# Altium schematic symbol library FPGA_Xilinx_Virtex7.SchLib: 34 symbols (part 14 of 34)
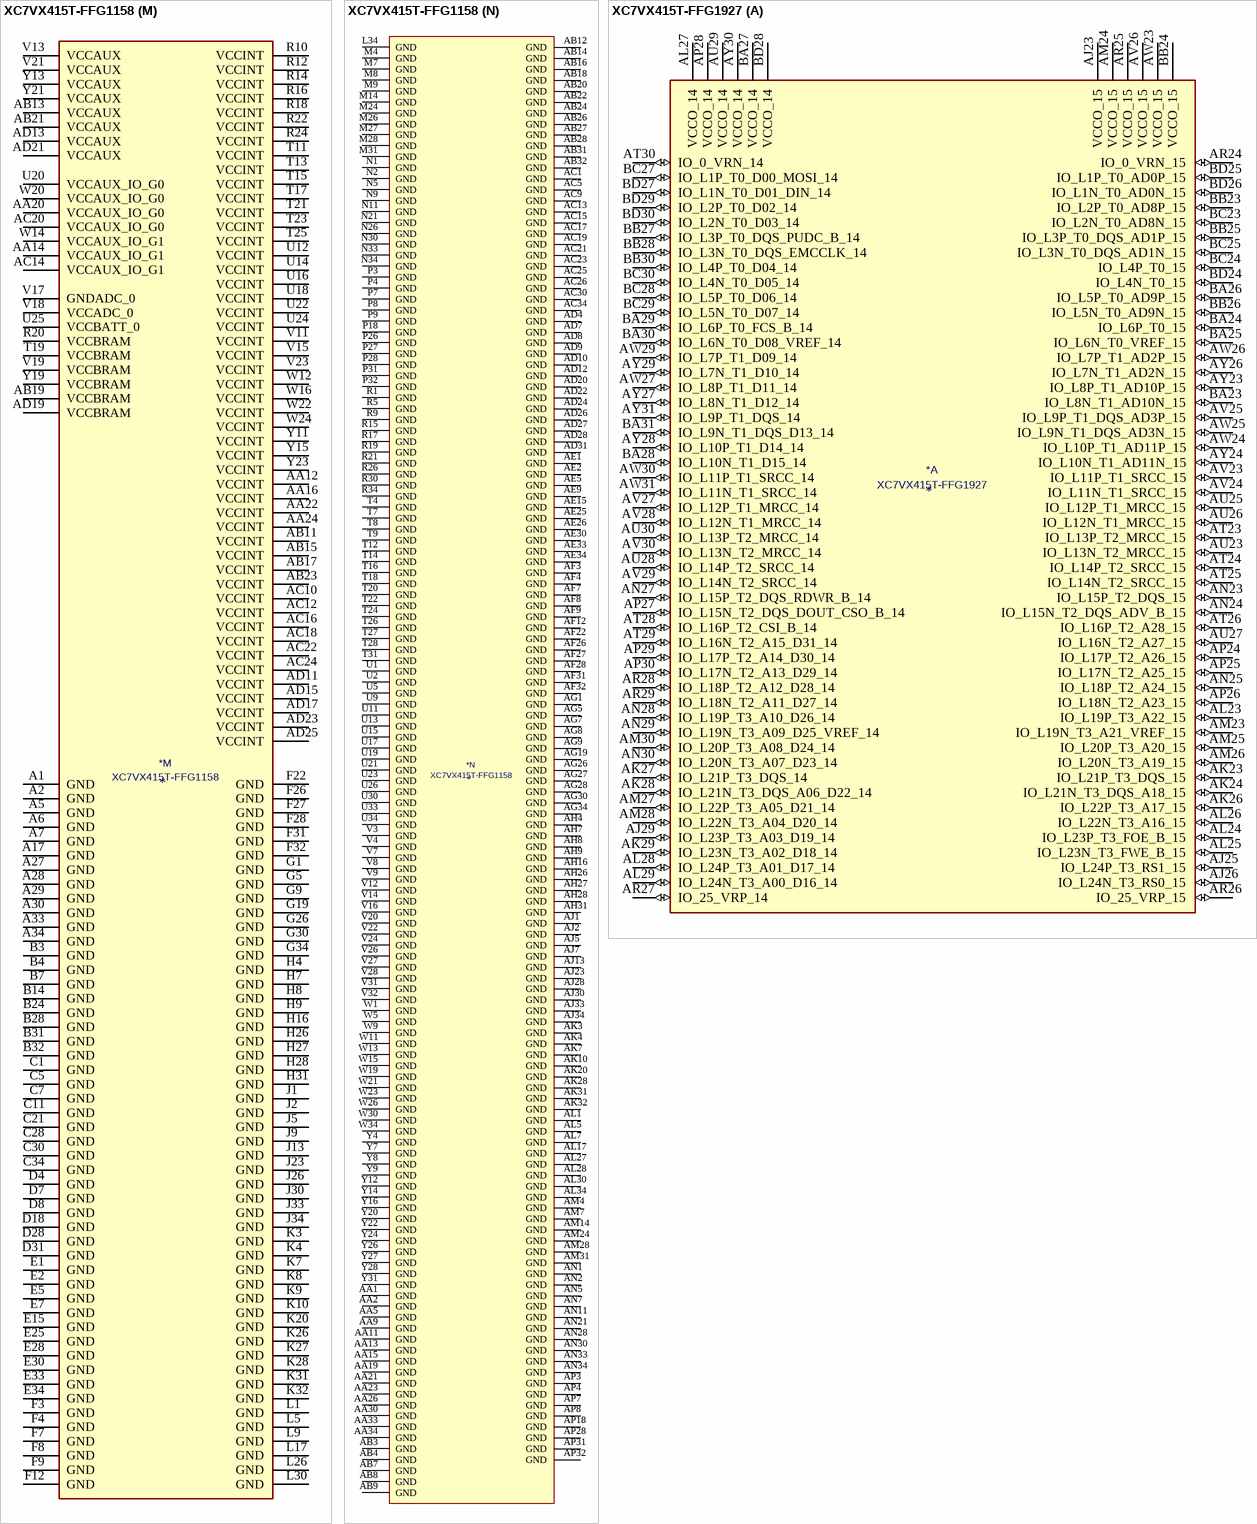
[diagram p185: symbols XC7VX415T-FFG1158 to XC7VX415T-FFG1927]

## XC7VX415T-FFG1158
designator *  value XC7VX415T-FFG1158
ki_keywords: FPGA; ki_description: Virtex 7 XT 415 XC7VX415T-FFG1158
part A pins: A8 IO_L23N_T3_FWE_B_15 (io), A9 IO_L21N_T3_DQS_A18_15 (io), A10 IO_L21P_T3_DQS_15 (io), A11 IO_L22N_T3_A16_15 (io), A12 VCCO_15 (power), A13 IO_L20N_T3_A19_15 (io), A23 IO_L1P_T0_D00_MOSI_14 (io), A24 IO_L1N_T0_D01_DIN_14 (io), A25 IO_L5N_T0_D07_14 (io), A26 IO_L2N_T0_D03_14 (io), B8 IO_L23P_T3_FOE_B_15 (io), B9 VCCO_15 (power), B10 IO_L24N_T3_RS0_15 (io), B11 IO_L24P_T3_RS1_15 (io), B12 IO_L22P_T3_A17_15 (io), B13 IO_L20P_T3_A20_15 (io), B23 IO_L3N_T0_DQS_EMCCLK_14 (io), B25 IO_L5P_T0_D06_14 (io), B26 IO_L2P_T0_D02_14 (io), B27 IO_L4N_T0_D05_14 (io), C8 IO_L19N_T3_A21_VREF_15 (io), C9 IO_L19P_T3_A22_15 (io), C10 IO_L18N_T2_A23_15 (io), C12 IO_L16N_T2_A27_15 (io), C13 IO_L16P_T2_A28_15 (io), C23 IO_L3P_T0_DQS_PUDC_B_14 (io), C24 IO_L6P_T0_FCS_B_14 (io), C25 IO_L6N_T0_D08_VREF_14 (io), C26 VCCO_14 (power), C27 IO_L4P_T0_D04_14 (io), D9 IO_L15N_T2_DQS_ADV_B_15 (io), D10 IO_L15P_T2_DQS_15 (io), D11 IO_L18P_T2_A24_15 (io), D12 IO_L14N_T2_SRCC_15 (io), D23 VCCO_14 (power), D24 IO_L9P_T1_DQS_14 (io), D25 IO_L9N_T1_DQS_D13_14 (io), D26 IO_L8N_T1_D12_14 (io), D27 IO_L10N_T1_D15_14 (io), E8 IO_L17N_T2_A25_15 (io), E9 IO_L17P_T2_A26_15 (io), E10 VCCO_15 (power), E11 IO_L13N_T2_MRCC_15 (io), E12 IO_L13P_T2_MRCC_15 (io), E13 IO_L14P_T2_SRCC_15 (io), E23 IO_L7N_T1_D10_14 (io), E24 IO_L11N_T1_SRCC_14 (io), E26 IO_L8P_T1_D11_14 (io), E27 IO_L10P_T1_D14_14 (io), F10 IO_L12N_T1_MRCC_15 (io), F11 IO_L11N_T1_SRCC_15 (io), F13 IO_L7N_T1_AD2N_15 (io), F23 IO_L7P_T1_D09_14 (io), F24 IO_L11P_T1_SRCC_14 (io), F25 IO_L12N_T1_MRCC_14 (io), G10 IO_L12P_T1_MRCC_15 (io), G11 IO_L11P_T1_SRCC_15 (io), G12 IO_L9N_T1_DQS_AD3N_15 (io), G13 IO_L7P_T1_AD2P_15 (io), G23 IO_L14N_T2_SRCC_14 (io), G24 VCCO_14 (power), G25 IO_L12P_T1_MRCC_14 (io), H10 IO_L10N_T1_AD11N_15 (io), H11 VCCO_15 (power), H12 IO_L9P_T1_DQS_AD3P_15 (io), H22 IO_L16N_T2_A15_D31_14 (io), H23 IO_L14P_T2_SRCC_14 (io), H24 IO_L13N_T2_MRCC_14 (io), H25 IO_L15N_T2_DQS_DOUT_CSO_B_14 (io), J10 IO_L10P_T1_AD11P_15 (io), J11 IO_L8N_T1_AD10N_15 (io), J12 IO_L1N_T0_AD0N_15 (io), J22 IO_L16P_T2_CSI_B_14 (io), J24 IO_L13P_T2_MRCC_14 (io), J25 IO_L15P_T2_DQS_RDWR_B_14 (io), K11 IO_L8P_T1_AD10P_15 (io), K12 IO_L1P_T0_AD0P_15 (io), K22 IO_L18P_T2_A12_D28_14 (io), K23 IO_L18N_T2_A11_D27_14 (io), K24 IO_L17N_T2_A13_D29_14 (io), K25 VCCO_14 (power), L10 IO_L3N_T0_DQS_AD1N_15 (io), L11 IO_L5N_T0_AD9N_15 (io), L12 VCCO_15 (power), L22 VCCO_14 (power), L23 IO_L20N_T3_A07_D23_14 (io), L24 IO_L17P_T2_A14_D30_14 (io), L25 IO_L23N_T3_A02_D18_14 (io), M10 IO_L3P_T0_DQS_AD1P_15 (io), M11 IO_L5P_T0_AD9P_15 (io), M12 IO_L2N_T0_AD8N_15 (io), M22 IO_L20P_T3_A08_D24_14 (io), M23 IO_L24N_T3_A00_D16_14 (io), M25 IO_L23P_T3_A03_D19_14 (io), N10 IO_L4N_T0_15 (io), N12 IO_L2P_T0_AD8P_15 (io), N22 IO_L22N_T3_A04_D20_14 (io), N23 IO_L24P_T3_A01_D17_14 (io), N24 IO_L19N_T3_A09_D25_VREF_14 (io), N25 IO_L21N_T3_DQS_A06_D22_14 (io), P10 IO_L4P_T0_15 (io), P11 IO_L6N_T0_VREF_15 (io), P12 IO_L6P_T0_15 (io), P13 VCCO_15 (power), P22 IO_L22P_T3_A05_D21_14 (io), P23 VCCO_14 (power), P24 IO_L19P_T3_A10_D26_14 (io), P25 IO_L21P_T3_DQS_14 (io), R11 IO_25_VRP_15 (io), R13 IO_0_VRN_15 (io), R23 IO_0_VRN_14 (io), R25 IO_25_VRP_14 (io)
part B pins: A14 IO_L1N_T0_16 (io), A15 IO_L1P_T0_16 (io), A16 IO_L4N_T0_16 (io), A18 IO_L4N_T0_17 (io), A19 IO_L1P_T0_17 (io), A20 IO_L1N_T0_17 (io), A21 IO_L3N_T0_DQS_17 (io), A22 VCCO_17 (power), B15 IO_L3N_T0_DQS_16 (io), B16 IO_L4P_T0_16 (io), B17 IO_L2N_T0_16 (io), B18 IO_L4P_T0_17 (io), B19 VCCO_17 (power), B20 IO_L2N_T0_17 (io), B21 IO_L3P_T0_DQS_17 (io), B22 IO_L5N_T0_17 (io), C14 IO_L5N_T0_16 (io), C15 IO_L3P_T0_DQS_16 (io), C16 VCCO_16 (power), C17 IO_L2P_T0_16 (io), C18 IO_L6P_T0_17 (io), C19 IO_L6N_T0_VREF_17 (io), C20 IO_L2P_T0_17 (io), C22 IO_L5P_T0_17 (io), D13 VCCO_16 (power), D14 IO_L10N_T1_16 (io), D15 IO_L5P_T0_16 (io), D16 IO_L6N_T0_VREF_16 (io), D17 IO_L6P_T0_16 (io), D19 IO_L9P_T1_DQS_17 (io), D20 IO_L9N_T1_DQS_17 (io), D21 IO_L11N_T1_SRCC_17 (io), D22 IO_L7N_T1_17 (io), E14 IO_L10P_T1_16 (io), E16 IO_L8N_T1_16 (io), E17 IO_L8P_T1_16 (io), E18 IO_L8P_T1_17 (io), E19 IO_L8N_T1_17 (io), E20 VCCO_17 (power), E21 IO_L11P_T1_SRCC_17 (io), E22 IO_L7P_T1_17 (io), F14 IO_L12N_T1_MRCC_16 (io), F15 IO_L12P_T1_MRCC_16 (io), F16 IO_L9N_T1_DQS_16 (io), F17 VCCO_16 (power), F18 IO_L10P_T1_17 (io), F19 IO_L10N_T1_17 (io), F20 IO_L12P_T1_MRCC_17 (io), F21 IO_L12N_T1_MRCC_17 (io), G14 VCCO_16 (power), G15 IO_L11N_T1_SRCC_16 (io), G16 IO_L9P_T1_DQS_16 (io), G17 IO_L7N_T1_16 (io), G18 IO_L15N_T2_DQS_17 (io), G20 IO_L13N_T2_MRCC_17 (io), G21 IO_L14P_T2_SRCC_17 (io), G22 IO_L14N_T2_SRCC_17 (io), H13 IO_L13N_T2_MRCC_16 (io), H14 IO_L13P_T2_MRCC_16 (io), H15 IO_L11P_T1_SRCC_16 (io), H17 IO_L7P_T1_16 (io), H18 IO_L15P_T2_DQS_17 (io), H19 IO_L18N_T2_17 (io), H20 IO_L13P_T2_MRCC_17 (io), H21 VCCO_17 (power), J14 IO_L14N_T2_SRCC_16 (io), J15 IO_L16N_T2_16 (io), J16 IO_L16P_T2_16 (io), J17 IO_0_VRN_16 (io), J18 VCCO_17 (power), J19 IO_L18P_T2_17 (io), J20 IO_L16P_T2_17 (io), J21 IO_L16N_T2_17 (io), K13 IO_L17N_T2_16 (io), K14 IO_L14P_T2_SRCC_16 (io), K15 VCCO_16 (power), K16 IO_L18N_T2_16 (io), K17 IO_L18P_T2_16 (io), K18 IO_L17P_T2_17 (io), K19 IO_L17N_T2_17 (io), K21 IO_0_VRN_17 (io), L13 IO_L17P_T2_16 (io), L14 IO_L15N_T2_DQS_16 (io), L15 IO_L15P_T2_DQS_16 (io), L16 IO_L20N_T3_16 (io), L18 IO_L19P_T3_17 (io), L19 IO_L19N_T3_VREF_17 (io), L20 IO_L22N_T3_17 (io), L21 IO_L20N_T3_17 (io), M13 IO_L19N_T3_VREF_16 (io), M15 IO_L22N_T3_16 (io), M16 IO_L20P_T3_16 (io), M17 IO_L24N_T3_16 (io), M18 IO_L21N_T3_DQS_17 (io), M19 VCCO_17 (power), M20 IO_L22P_T3_17 (io), M21 IO_L20P_T3_17 (io), N13 IO_L19P_T3_16 (io), N14 IO_L21N_T3_DQS_16 (io), N15 IO_L22P_T3_16 (io), N16 VCCO_16 (power), N17 IO_L24P_T3_16 (io), N18 IO_L21P_T3_DQS_17 (io), N19 IO_L23N_T3_17 (io), N20 IO_L24N_T3_17 (io), P14 IO_L21P_T3_DQS_16 (io), P15 IO_L23N_T3_16 (io), P16 IO_L23P_T3_16 (io), P17 IO_25_VRP_16 (io), P19 IO_L23P_T3_17 (io), P20 IO_L24P_T3_17 (io), P21 IO_25_VRP_17 (io)
part C pins: AD16 IO_25_VRP_34 (io), AD18 IO_0_VRN_34 (io), AE16 IO_L1N_T0_34 (io), AE17 IO_L1P_T0_34 (io), AE18 IO_L5P_T0_34 (io), AE19 IO_L3P_T0_DQS_34 (io), AE20 VCCO_34 (power), AE21 IO_25_VRP_35 (io), AE22 IO_0_VRN_35 (io), AE23 IO_L2P_T0_AD12P_35 (io), AE24 IO_L4P_T0_35 (io), AF15 IO_L15P_T2_DQS_34 (io), AF16 IO_L6P_T0_34 (io), AF17 VCCO_34 (power), AF18 IO_L5N_T0_34 (io), AF19 IO_L3N_T0_DQS_34 (io), AF20 IO_L2P_T0_34 (io), AF21 IO_L6P_T0_35 (io), AF23 IO_L2N_T0_AD12N_35 (io), AF24 IO_L4N_T0_35 (io), AF25 IO_L1P_T0_AD4P_35 (io), AG15 IO_L15N_T2_DQS_34 (io), AG16 IO_L6N_T0_VREF_34 (io), AG17 IO_L4N_T0_34 (io), AG18 IO_L4P_T0_34 (io), AG20 IO_L2N_T0_34 (io), AG21 IO_L6N_T0_VREF_35 (io), AG22 IO_L5P_T0_AD13P_35 (io), AG23 IO_L3P_T0_DQS_AD5P_35 (io), AG24 VCCO_35 (power), AG25 IO_L1N_T0_AD4N_35 (io), AH15 IO_L17P_T2_34 (io), AH17 IO_L16N_T2_34 (io), AH18 IO_L16P_T2_34 (io), AH19 IO_L18P_T2_34 (io), AH20 IO_L7P_T1_34 (io), AH21 VCCO_35 (power), AH22 IO_L5N_T0_AD13N_35 (io), AH23 IO_L3N_T0_DQS_AD5N_35 (io), AH24 IO_L11P_T1_SRCC_35 (io), AH25 IO_L9P_T1_DQS_AD7P_35 (io), AJ15 IO_L17N_T2_34 (io), AJ16 IO_L13P_T2_MRCC_34 (io), AJ17 IO_L14P_T2_SRCC_34 (io), AJ18 VCCO_34 (power), AJ19 IO_L18N_T2_34 (io), AJ20 IO_L7N_T1_34 (io), AJ21 IO_L10P_T1_AD15P_35 (io), AJ22 IO_L8P_T1_AD14P_35 (io), AJ24 IO_L11N_T1_SRCC_35 (io), AJ25 IO_L9N_T1_DQS_AD7N_35 (io), AJ26 IO_L7P_T1_AD6P_35 (io), AJ27 IO_L19P_T3_35 (io), AK15 VCCO_34 (power), AK16 IO_L13N_T2_MRCC_34 (io), AK17 IO_L14N_T2_SRCC_34 (io), AK18 IO_L12P_T1_MRCC_34 (io), AK19 IO_L11P_T1_SRCC_34 (io), AK21 IO_L10N_T1_AD15N_35 (io), AK22 IO_L8N_T1_AD14N_35 (io), AK23 IO_L12P_T1_MRCC_35 (io), AK24 IO_L12N_T1_MRCC_35 (io), AK25 VCCO_35 (power), AK26 IO_L7N_T1_AD6N_35 (io), AK27 IO_L19N_T3_VREF_35 (io), AL15 IO_L19P_T3_34 (io), AL16 IO_L20P_T3_34 (io), AL18 IO_L12N_T1_MRCC_34 (io), AL19 IO_L11N_T1_SRCC_34 (io), AL20 IO_L9P_T1_DQS_34 (io), AL21 IO_L17P_T2_35 (io), AL22 VCCO_35 (power), AL23 IO_L14P_T2_SRCC_35 (io), AL24 IO_L14N_T2_SRCC_35 (io), AL25 IO_L13P_T2_MRCC_35 (io), AL26 IO_L13N_T2_MRCC_35 (io), AM15 IO_L19N_T3_VREF_34 (io), AM16 IO_L20N_T3_34 (io), AM17 IO_L8N_T1_34 (io), AM18 IO_L8P_T1_34 (io), AM19 VCCO_34 (power), AM20 IO_L9N_T1_DQS_34 (io), AM21 IO_L17N_T2_35 (io), AM22 IO_L16P_T2_35 (io), AM23 IO_L15P_T2_DQS_35 (io), AM25 IO_L20P_T3_35 (io), AM26 IO_L20N_T3_35 (io), AM27 IO_L21P_T3_DQS_35 (io), AN15 IO_L23P_T3_34 (io), AN16 VCCO_34 (power), AN17 IO_L22N_T3_34 (io), AN18 IO_L22P_T3_34 (io), AN19 IO_L24P_T3_34 (io), AN20 IO_L10P_T1_34 (io), AN22 IO_L16N_T2_35 (io), AN23 IO_L15N_T2_DQS_35 (io), AN24 IO_L22P_T3_35 (io), AN25 IO_L24P_T3_35 (io), AN26 VCCO_35 (power), AN27 IO_L21N_T3_DQS_35 (io), AP15 IO_L23N_T3_34 (io), AP16 IO_L21N_T3_DQS_34 (io), AP17 IO_L21P_T3_DQS_34 (io), AP19 IO_L24N_T3_34 (io), AP20 IO_L10N_T1_34 (io), AP21 IO_L18P_T2_35 (io), AP22 IO_L18N_T2_35 (io), AP23 VCCO_35 (power), AP24 IO_L22N_T3_35 (io), AP25 IO_L24N_T3_35 (io), AP26 IO_L23P_T3_35 (io), AP27 IO_L23N_T3_35 (io)
part D pins: AD14 IO_25_VRP_36 (io), AE11 IO_L3P_T0_DQS_36 (io), AE12 IO_0_VRN_36 (io), AE13 IO_L16P_T2_36 (io), AE14 IO_L18P_T2_36 (io), AF10 IO_L3N_T0_DQS_36 (io), AF11 IO_L5P_T0_36 (io), AF13 IO_L16N_T2_36 (io), AF14 IO_L18N_T2_36 (io), AG10 IO_L6P_T0_36 (io), AG11 IO_L5N_T0_36 (io), AG12 IO_L15P_T2_DQS_36 (io), AG13 IO_L17P_T2_36 (io), AG14 VCCO_36 (power), AH10 IO_L6N_T0_VREF_36 (io), AH11 VCCO_36 (power), AH12 IO_L15N_T2_DQS_36 (io), AH13 IO_L17N_T2_36 (io), AH14 IO_L19P_T3_36 (io), AJ8 VCCO_36 (power), AJ9 IO_L1N_T0_36 (io), AJ10 IO_L1P_T0_36 (io), AJ11 IO_L13P_T2_MRCC_36 (io), AJ12 IO_L14P_T2_SRCC_36 (io), AJ14 IO_L19N_T3_VREF_36 (io), AK8 IO_L2P_T0_36 (io), AK9 IO_L4P_T0_36 (io), AK11 IO_L13N_T2_MRCC_36 (io), AK12 IO_L14N_T2_SRCC_36 (io), AK13 IO_L21P_T3_DQS_36 (io), AK14 IO_L23P_T3_36 (io), AL8 IO_L2N_T0_36 (io), AL9 IO_L4N_T0_36 (io), AL10 IO_L12P_T1_MRCC_36 (io), AL11 IO_L11P_T1_SRCC_36 (io), AL12 VCCO_36 (power), AL13 IO_L21N_T3_DQS_36 (io), AL14 IO_L23N_T3_36 (io), AM8 IO_L8P_T1_36 (io), AM9 VCCO_36 (power), AM10 IO_L12N_T1_MRCC_36 (io), AM11 IO_L11N_T1_SRCC_36 (io), AM12 IO_L20P_T3_36 (io), AM13 IO_L22P_T3_36 (io), AN8 IO_L8N_T1_36 (io), AN9 IO_L10P_T1_36 (io), AN10 IO_L7P_T1_36 (io), AN12 IO_L20N_T3_36 (io), AN13 IO_L22N_T3_36 (io), AN14 IO_L24P_T3_36 (io), AP9 IO_L10N_T1_36 (io), AP10 IO_L7N_T1_36 (io), AP11 IO_L9N_T1_DQS_36 (io), AP12 IO_L9P_T1_DQS_36 (io), AP13 VCCO_36 (power), AP14 IO_L24N_T3_36 (io)
part E pins: AB5 MGTREFCLK0N_115 (io), AB6 MGTREFCLK0P_115 (io), AC7 MGTREFCLK1N_115 (io), AC8 MGTREFCLK1P_115 (io), AD1 MGTHTXN3_115 (io), AD2 MGTHTXP3_115 (io), AD5 MGTREFCLK0N_114 (io), AD6 MGTREFCLK0P_114 (io), AE3 MGTHRXN3_115 (io), AE4 MGTHRXP3_115 (io), AE7 MGTREFCLK1N_114 (io), AE8 MGTREFCLK1P_114 (io), AF1 MGTHTXN2_115 (io), AF2 MGTHTXP2_115 (io), AF5 MGTHRXN2_115 (io), AF6 MGTHRXP2_115 (io), AG3 MGTHRXN1_115 (io), AG4 MGTHRXP1_115 (io), AH1 MGTHTXN1_115 (io), AH2 MGTHTXP1_115 (io), AH5 MGTHRXN0_115 (io), AH6 MGTHRXP0_115 (io), AJ3 MGTHTXN0_115 (io), AJ4 MGTHTXP0_115 (io), AK1 MGTHTXN3_114 (io), AK2 MGTHTXP3_114 (io), AK5 MGTHRXN3_114 (io), AK6 MGTHRXP3_114 (io), AL3 MGTHRXN2_114 (io), AL4 MGTHRXP2_114 (io), AM1 MGTHTXN2_114 (io), AM2 MGTHTXP2_114 (io), AM5 MGTHRXN1_114 (io), AM6 MGTHRXP1_114 (io), AN3 MGTHTXN1_114 (io), AN4 MGTHTXP1_114 (io), AP1 MGTHTXN0_114 (io), AP2 MGTHTXP0_114 (io), AP5 MGTHRXN0_114 (io), AP6 MGTHRXP0_114 (io)
part F pins: AA3 MGTHRXN1_116 (io), AA4 MGTHRXP1_116 (io), AA7 MGTREFCLK1N_116 (io), AA8 MGTREFCLK1P_116 (io), AB1 MGTHTXN0_116 (io), AB2 MGTHTXP0_116 (io), AC3 MGTHRXN0_116 (io), AC4 MGTHRXP0_116 (io), L3 MGTHRXN3_117 (io), L4 MGTHRXP3_117 (io), N3 MGTHTXN3_117 (io), N4 MGTHTXP3_117 (io), P1 MGTHTXN2_117 (io), P2 MGTHTXP2_117 (io), P5 MGTHRXN2_117 (io), P6 MGTHRXP2_117 (io), R3 MGTHRXN1_117 (io), R4 MGTHRXP1_117 (io), R7 MGTREFCLK0N_117 (io), R8 MGTREFCLK0P_117 (io), T1 MGTHTXN1_117 (io), T2 MGTHTXP1_117 (io), T5 MGTHRXN0_117 (io), T6 MGTHRXP0_117 (io), U3 MGTHTXN0_117 (io), U4 MGTHTXP0_117 (io), U7 MGTREFCLK1N_117 (io), U8 MGTREFCLK1P_117 (io), V1 MGTHTXN3_116 (io), V2 MGTHTXP3_116 (io), V5 MGTHRXN3_116 (io), V6 MGTHRXP3_116 (io), W3 MGTHTXN2_116 (io), W4 MGTHTXP2_116 (io), W7 MGTREFCLK0N_116 (io), W8 MGTREFCLK0P_116 (io), Y1 MGTHTXN1_116 (io), Y2 MGTHTXP1_116 (io), Y5 MGTHRXN2_116 (io), Y6 MGTHRXP2_116 (io)
part G pins: A3 MGTHTXN3_119 (io), A4 MGTHTXP3_119 (io), B1 MGTHTXN2_119 (io), B2 MGTHTXP2_119 (io), B5 MGTHRXN3_119 (io), B6 MGTHRXP3_119 (io), C3 MGTHRXN2_119 (io), C4 MGTHRXP2_119 (io), D1 MGTHTXN1_119 (io), D2 MGTHTXP1_119 (io), D5 MGTHRXN1_119 (io), D6 MGTHRXP1_119 (io), E3 MGTHRXN0_119 (io), E4 MGTHRXP0_119 (io), F1 MGTHTXN0_119 (io), F2 MGTHTXP0_119 (io), F5 MGTHRXN3_118 (io), F6 MGTHRXP3_118 (io), G3 MGTHTXN3_118 (io), G4 MGTHTXP3_118 (io), H1 MGTHTXN2_118 (io), H2 MGTHTXP2_118 (io), H5 MGTHRXN2_118 (io), H6 MGTHRXP2_118 (io), J3 MGTHRXN1_118 (io), J4 MGTHRXP1_118 (io), J7 MGTREFCLK0N_119 (io), J8 MGTREFCLK0P_119 (io), K1 MGTHTXN1_118 (io), K2 MGTHTXP1_118 (io), K5 MGTHRXN0_118 (io), K6 MGTHRXP0_118 (io), L7 MGTREFCLK1N_119 (io), L8 MGTREFCLK1P_119 (io), M1 MGTHTXN0_118 (io), M2 MGTHTXP0_118 (io), M5 MGTREFCLK0N_118 (io), M6 MGTREFCLK0P_118 (io), N7 MGTREFCLK1N_118 (io), N8 MGTREFCLK1P_118 (io)
part H pins: AB29 MGTREFCLK0P_215 (io), AB30 MGTREFCLK0N_215 (io), AC27 MGTREFCLK1P_215 (io), AC28 MGTREFCLK1N_215 (io), AD29 MGTREFCLK0P_214 (io), AD30 MGTREFCLK0N_214 (io), AD33 MGTHTXP3_215 (io), AD34 MGTHTXN3_215 (io), AE27 MGTREFCLK1P_214 (io), AE28 MGTREFCLK1N_214 (io), AE31 MGTHRXP3_215 (io), AE32 MGTHRXN3_215 (io), AF29 MGTHRXP2_215 (io), AF30 MGTHRXN2_215 (io), AF33 MGTHTXP2_215 (io), AF34 MGTHTXN2_215 (io), AG31 MGTHRXP1_215 (io), AG32 MGTHRXN1_215 (io), AH29 MGTHRXP0_215 (io), AH30 MGTHRXN0_215 (io), AH33 MGTHTXP1_215 (io), AH34 MGTHTXN1_215 (io), AJ31 MGTHTXP0_215 (io), AJ32 MGTHTXN0_215 (io), AK29 MGTHRXP3_214 (io), AK30 MGTHRXN3_214 (io), AK33 MGTHTXP3_214 (io), AK34 MGTHTXN3_214 (io), AL31 MGTHRXP2_214 (io), AL32 MGTHRXN2_214 (io), AM29 MGTHRXP1_214 (io), AM30 MGTHRXN1_214 (io), AM33 MGTHTXP2_214 (io), AM34 MGTHTXN2_214 (io), AN31 MGTHTXP1_214 (io), AN32 MGTHTXN1_214 (io), AP29 MGTHRXP0_214 (io), AP30 MGTHRXN0_214 (io), AP33 MGTHTXP0_214 (io), AP34 MGTHTXN0_214 (io)
part I pins: AA27 MGTREFCLK1P_216 (io), AA28 MGTREFCLK1N_216 (io), AA31 MGTHRXP1_216 (io), AA32 MGTHRXN1_216 (io), AB33 MGTHTXP0_216 (io), AB34 MGTHTXN0_216 (io), AC31 MGTHRXP0_216 (io), AC32 MGTHRXN0_216 (io), L31 MGTHRXP3_217 (io), L32 MGTHRXN3_217 (io), N31 MGTHTXP3_217 (io), N32 MGTHTXN3_217 (io), P29 MGTHRXP2_217 (io), P30 MGTHRXN2_217 (io), P33 MGTHTXP2_217 (io), P34 MGTHTXN2_217 (io), R27 MGTREFCLK0P_217 (io), R28 MGTREFCLK0N_217 (io), R31 MGTHRXP1_217 (io), R32 MGTHRXN1_217 (io), T29 MGTHRXP0_217 (io), T30 MGTHRXN0_217 (io), T33 MGTHTXP1_217 (io), T34 MGTHTXN1_217 (io), U27 MGTREFCLK1P_217 (io), U28 MGTREFCLK1N_217 (io), U31 MGTHTXP0_217 (io), U32 MGTHTXN0_217 (io), V29 MGTHRXP3_216 (io), V30 MGTHRXN3_216 (io), V33 MGTHTXP3_216 (io), V34 MGTHTXN3_216 (io), W27 MGTREFCLK0P_216 (io), W28 MGTREFCLK0N_216 (io), W31 MGTHTXP2_216 (io), W32 MGTHTXN2_216 (io), Y29 MGTHRXP2_216 (io), Y30 MGTHRXN2_216 (io), Y33 MGTHTXP1_216 (io), Y34 MGTHTXN1_216 (io)
part J pins: A31 MGTHTXP3_219 (io), A32 MGTHTXN3_219 (io), B29 MGTHRXP3_219 (io), B30 MGTHRXN3_219 (io), B33 MGTHTXP2_219 (io), B34 MGTHTXN2_219 (io), C31 MGTHRXP2_219 (io), C32 MGTHRXN2_219 (io), D29 MGTHRXP1_219 (io), D30 MGTHRXN1_219 (io), D33 MGTHTXP1_219 (io), D34 MGTHTXN1_219 (io), E31 MGTHRXP0_219 (io), E32 MGTHRXN0_219 (io), F29 MGTHRXP3_218 (io), F30 MGTHRXN3_218 (io), F33 MGTHTXP0_219 (io), F34 MGTHTXN0_219 (io), G31 MGTHTXP3_218 (io), G32 MGTHTXN3_218 (io), H29 MGTHRXP2_218 (io), H30 MGTHRXN2_218 (io), H33 MGTHTXP2_218 (io), H34 MGTHTXN2_218 (io), J27 MGTREFCLK0P_219 (io), J28 MGTREFCLK0N_219 (io), J31 MGTHRXP1_218 (io), J32 MGTHRXN1_218 (io), K29 MGTHRXP0_218 (io), K30 MGTHRXN0_218 (io), K33 MGTHTXP1_218 (io), K34 MGTHTXN1_218 (io), L27 MGTREFCLK1P_219 (io), L28 MGTREFCLK1N_219 (io), M29 MGTREFCLK0P_218 (io), M30 MGTREFCLK0N_218 (io), M33 MGTHTXP0_218 (io), M34 MGTHTXN0_218 (io), N27 MGTREFCLK1P_218 (io), N28 MGTREFCLK1N_218 (io)
part K pins: AA6 MGTAVCC_G10 (power), AA29 MGTAVCC_G20 (power), AC2 MGTAVTT_G10 (power), AC6 MGTAVCC_G10 (power), AC29 MGTAVCC_G20 (power), AC33 MGTAVTT_G20 (power), AD3 MGTAVTT_G10 (power), AD32 MGTAVTT_G20 (power), AE6 MGTAVCC_G10 (power), AE29 MGTAVCC_G20 (power), AG2 MGTAVTT_G10 (power), AG6 MGTAVCC_G10 (power), AG29 MGTAVCC_G20 (power), AG33 MGTAVTT_G20 (power), AH3 MGTAVTT_G10 (power), AH32 MGTAVTT_G20 (power), AJ6 MGTAVCC_G10 (power), AJ29 MGTAVCC_G20 (power), AL2 MGTAVTT_G10 (power), AL6 MGTAVCC_G10 (power), AL29 MGTAVCC_G20 (power), AL33 MGTAVTT_G20 (power), AM3 MGTAVTT_G10 (power), AM32 MGTAVTT_G20 (power), AN6 MGTAVCC_G10 (power), AN29 MGTAVCC_G20 (power), C2 MGTAVTT_G11 (power), C6 MGTAVCC_G11 (power), C29 MGTAVCC_G21 (power), C33 MGTAVTT_G21 (power), D3 MGTAVTT_G11 (power), D32 MGTAVTT_G21 (power), E6 MGTAVCC_G11 (power), E29 MGTAVCC_G21 (power), G2 MGTAVTT_G11 (power), G6 MGTAVCC_G11 (power), G7 MGTRREF_115 (power), G8 MGTAVTTRCAL_115 (power), G27 MGTAVTTRCAL_215 (power), G28 MGTRREF_215 (power), G29 MGTAVCC_G21 (power), G33 MGTAVTT_G21 (power), H3 MGTAVTT_G11 (power), H32 MGTAVTT_G21 (power), J6 MGTAVCC_G11 (power), J29 MGTAVCC_G21 (power), L2 MGTAVTT_G11 (power), L6 MGTAVCC_G11 (power), L29 MGTAVCC_G21 (power), L33 MGTAVTT_G21 (power), M3 MGTAVTT_G11 (power), M32 MGTAVTT_G21 (power), N6 MGTAVCC_G11 (power), N29 MGTAVCC_G21 (power), R2 MGTAVTT_G11 (power), R6 MGTAVCC_G11 (power), R29 MGTAVCC_G21 (power), R33 MGTAVTT_G21 (power), T3 MGTAVTT_G11 (power), T32 MGTAVTT_G21 (power), U6 MGTVCCAUX_G11 (power), U29 MGTVCCAUX_G21 (power), W2 MGTAVTT_G10 (power), W6 MGTVCCAUX_G10 (power), W29 MGTVCCAUX_G20 (power), W33 MGTAVTT_G20 (power), Y3 MGTAVTT_G10 (power), Y32 MGTAVTT_G20 (power)
part L pins: AA10 M0_0 (io), AA17 DXN_0 (io), AA18 DXP_0 (io), AA25 TDO_0 (io), AB10 DONE_0 (io), AB25 TDI_0 (io), AC11 VCCO_0 (power), AE10 VCCO_0 (power), T10 INIT_B_0 (io), U10 CFGBVS_0 (io), V10 PROGRAM_B_0 (io), V25 CCLK_0 (io), W10 M2_0 (io), W17 VREFN_0 (io), W18 VP_0 (io), W25 TMS_0 (io), Y10 M1_0 (io), Y17 VN_0 (io), Y18 VREFP_0 (io), Y25 TCK_0 (io)
part M pins: A1 GND (power), A2 GND (power), A5 GND (power), A6 GND (power), A7 GND (power), A17 GND (power), A27 GND (power), A28 GND (power), A29 GND (power), A30 GND (power), A33 GND (power), A34 GND (power), AA12 VCCINT (power), AA14 VCCAUX_IO_G1 (power), AA16 VCCINT (power), AA20 VCCAUX_IO_G0 (power), AA22 VCCINT (power), AA24 VCCINT (power), AB11 VCCINT (power), AB13 VCCAUX (power), AB15 VCCINT (power), AB17 VCCINT (power), AB19 VCCBRAM (power), AB21 VCCAUX (power), AB23 VCCINT (power), AC10 VCCINT (power), AC12 VCCINT (power), AC14 VCCAUX_IO_G1 (power), AC16 VCCINT (power), AC18 VCCINT (power), AC20 VCCAUX_IO_G0 (power), AC22 VCCINT (power), AC24 VCCINT (power), AD11 VCCINT (power), AD13 VCCAUX (power), AD15 VCCINT (power), AD17 VCCINT (power), AD19 VCCBRAM (power), AD21 VCCAUX (power), AD23 VCCINT (power), AD25 VCCINT (power), B3 GND (power), B4 GND (power), B7 GND (power), B14 GND (power), B24 GND (power), B28 GND (power), B31 GND (power), B32 GND (power), C1 GND (power), C5 GND (power), C7 GND (power), C11 GND (power), C21 GND (power), C28 GND (power), C30 GND (power), C34 GND (power), D4 GND (power), D7 GND (power), D8 GND (power), D18 GND (power), D28 GND (power), D31 GND (power), E1 GND (power), E2 GND (power), E5 GND (power), E7 GND (power), E15 GND (power), E25 GND (power), E28 GND (power), E30 GND (power), E33 GND (power), E34 GND (power), F3 GND (power), F4 GND (power), F7 GND (power), F8 GND (power), F9 GND (power), F12 GND (power), F22 GND (power), F26 GND (power), F27 GND (power), F28 GND (power), F31 GND (power), F32 GND (power), G1 GND (power), G5 GND (power), G9 GND (power), G19 GND (power), G26 GND (power), G30 GND (power), G34 GND (power), H4 GND (power), H7 GND (power), H8 GND (power), H9 GND (power), H16 GND (power), H26 GND (power), H27 GND (power), H28 GND (power), H31 GND (power), J1 GND (power), J2 GND (power), J5 GND (power), J9 GND (power), J13 GND (power), J23 GND (power), J26 GND (power), J30 GND (power), J33 GND (power), J34 GND (power), K3 GND (power), K4 GND (power), K7 GND (power), K8 GND (power), K9 GND (power), K10 GND (power), K20 GND (power), K26 GND (power), K27 GND (power), K28 GND (power), K31 GND (power), K32 GND (power), L1 GND (power), L5 GND (power), L9 GND (power), L17 GND (power), L26 GND (power), L30 GND (power), R10 VCCINT (power), R12 VCCINT (power), R14 VCCINT (power), R16 VCCINT (power), R18 VCCINT (power), R20 VCCBRAM (power), R22 VCCINT (power), R24 VCCINT (power), T11 VCCINT (power), T13 VCCINT (power), T15 VCCINT (power), T17 VCCINT (power), T19 VCCBRAM (power), T21 VCCINT (power), T23 VCCINT (power), T25 VCCINT (power), U12 VCCINT (power), U14 VCCINT (power), U16 VCCINT (power), U18 VCCINT (power), U20 VCCAUX_IO_G0 (power), U22 VCCINT (power), U24 VCCINT (power), U25 VCCBATT_0 (power), V11 VCCINT (power), V13 VCCAUX (power), V15 VCCINT (power), V17 GNDADC_0 (power), V18 VCCADC_0 (power), V19 VCCBRAM (power), V21 VCCAUX (power), V23 VCCINT (power), W12 VCCINT (power), W14 VCCAUX_IO_G1 (power), W16 VCCINT (power), W20 VCCAUX_IO_G0 (power), W22 VCCINT (power), W24 VCCINT (power), Y11 VCCINT (power), Y13 VCCAUX (power), Y15 VCCINT (power), Y19 VCCBRAM (power), Y21 VCCAUX (power), Y23 VCCINT (power)
part N pins: AA1 GND (power), AA2 GND (power), AA5 GND (power), AA9 GND (power), AA11 GND (power), AA13 GND (power), AA15 GND (power), AA19 GND (power), AA21 GND (power), AA23 GND (power), AA26 GND (power), AA30 GND (power), AA33 GND (power), AA34 GND (power), AB3 GND (power), AB4 GND (power), AB7 GND (power), AB8 GND (power), AB9 GND (power), AB12 GND (power), AB14 GND (power), AB16 GND (power), AB18 GND (power), AB20 GND (power), AB22 GND (power), AB24 GND (power), AB26 GND (power), AB27 GND (power), AB28 GND (power), AB31 GND (power), AB32 GND (power), AC1 GND (power), AC5 GND (power), AC9 GND (power), AC13 GND (power), AC15 GND (power), AC17 GND (power), AC19 GND (power), AC21 GND (power), AC23 GND (power), AC25 GND (power), AC26 GND (power), AC30 GND (power), AC34 GND (power), AD4 GND (power), AD7 GND (power), AD8 GND (power), AD9 GND (power), AD10 GND (power), AD12 GND (power), AD20 GND (power), AD22 GND (power), AD24 GND (power), AD26 GND (power), AD27 GND (power), AD28 GND (power), AD31 GND (power), AE1 GND (power), AE2 GND (power), AE5 GND (power), AE9 GND (power), AE15 GND (power), AE25 GND (power), AE26 GND (power), AE30 GND (power), AE33 GND (power), AE34 GND (power), AF3 GND (power), AF4 GND (power), AF7 GND (power), AF8 GND (power), AF9 GND (power), AF12 GND (power), AF22 GND (power), AF26 GND (power), AF27 GND (power), AF28 GND (power), AF31 GND (power), AF32 GND (power), AG1 GND (power), AG5 GND (power), AG7 GND (power), AG8 GND (power), AG9 GND (power), AG19 GND (power), AG26 GND (power), AG27 GND (power), AG28 GND (power), AG30 GND (power), AG34 GND (power), AH4 GND (power), AH7 GND (power), AH8 GND (power), AH9 GND (power), AH16 GND (power), AH26 GND (power), AH27 GND (power), AH28 GND (power), AH31 GND (power), AJ1 GND (power), AJ2 GND (power), AJ5 GND (power), AJ7 GND (power), AJ13 GND (power), AJ23 GND (power), AJ28 GND (power), AJ30 GND (power), AJ33 GND (power), AJ34 GND (power), AK3 GND (power), AK4 GND (power), AK7 GND (power), AK10 GND (power), AK20 GND (power), AK28 GND (power), AK31 GND (power), AK32 GND (power), AL1 GND (power), AL5 GND (power), AL7 GND (power), AL17 GND (power), AL27 GND (power), AL28 GND (power), AL30 GND (power), AL34 GND (power), AM4 GND (power), AM7 GND (power), AM14 GND (power), AM24 GND (power), AM28 GND (power), AM31 GND (power), AN1 GND (power), AN2 GND (power), AN5 GND (power), AN7 GND (power), AN11 GND (power), AN21 GND (power), AN28 GND (power), AN30 GND (power), AN33 GND (power), AN34 GND (power), AP3 GND (power), AP4 GND (power), AP7 GND (power), AP8 GND (power), AP18 GND (power), AP28 GND (power), AP31 GND (power), AP32 GND (power), L34 GND (power), M4 GND (power), M7 GND (power), M8 GND (power), M9 GND (power), M14 GND (power), M24 GND (power), M26 GND (power), M27 GND (power), M28 GND (power), M31 GND (power), N1 GND (power), N2 GND (power), N5 GND (power), N9 GND (power), N11 GND (power), N21 GND (power), N26 GND (power), N30 GND (power), N33 GND (power), N34 GND (power), P3 GND (power), P4 GND (power), P7 GND (power), P8 GND (power), P9 GND (power), P18 GND (power), P26 GND (power), P27 GND (power), P28 GND (power), P31 GND (power), P32 GND (power), R1 GND (power), R5 GND (power), R9 GND (power), R15 GND (power), R17 GND (power), R19 GND (power), R21 GND (power), R26 GND (power), R30 GND (power), R34 GND (power), T4 GND (power), T7 GND (power), T8 GND (power), T9 GND (power), T12 GND (power), T14 GND (power), T16 GND (power), T18 GND (power), T20 GND (power), T22 GND (power), T24 GND (power), T26 GND (power), T27 GND (power), T28 GND (power), T31 GND (power), U1 GND (power), U2 GND (power), U5 GND (power), U9 GND (power), U11 GND (power), U13 GND (power), U15 GND (power), U17 GND (power), U19 GND (power), U21 GND (power), U23 GND (power), U26 GND (power), U30 GND (power), U33 GND (power), U34 GND (power), V3 GND (power), V4 GND (power), V7 GND (power), V8 GND (power), V9 GND (power), V12 GND (power), V14 GND (power), V16 GND (power), V20 GND (power), V22 GND (power), V24 GND (power), V26 GND (power), V27 GND (power), V28 GND (power), V31 GND (power), V32 GND (power), W1 GND (power), W5 GND (power), W9 GND (power), W11 GND (power), W13 GND (power), W15 GND (power), W19 GND (power), W21 GND (power), W23 GND (power), W26 GND (power), W30 GND (power), W34 GND (power), Y4 GND (power), Y7 GND (power), Y8 GND (power), Y9 GND (power), Y12 GND (power), Y14 GND (power), Y16 GND (power), Y20 GND (power), Y22 GND (power), Y24 GND (power), Y26 GND (power), Y27 GND (power), Y28 GND (power), Y31 GND (power)

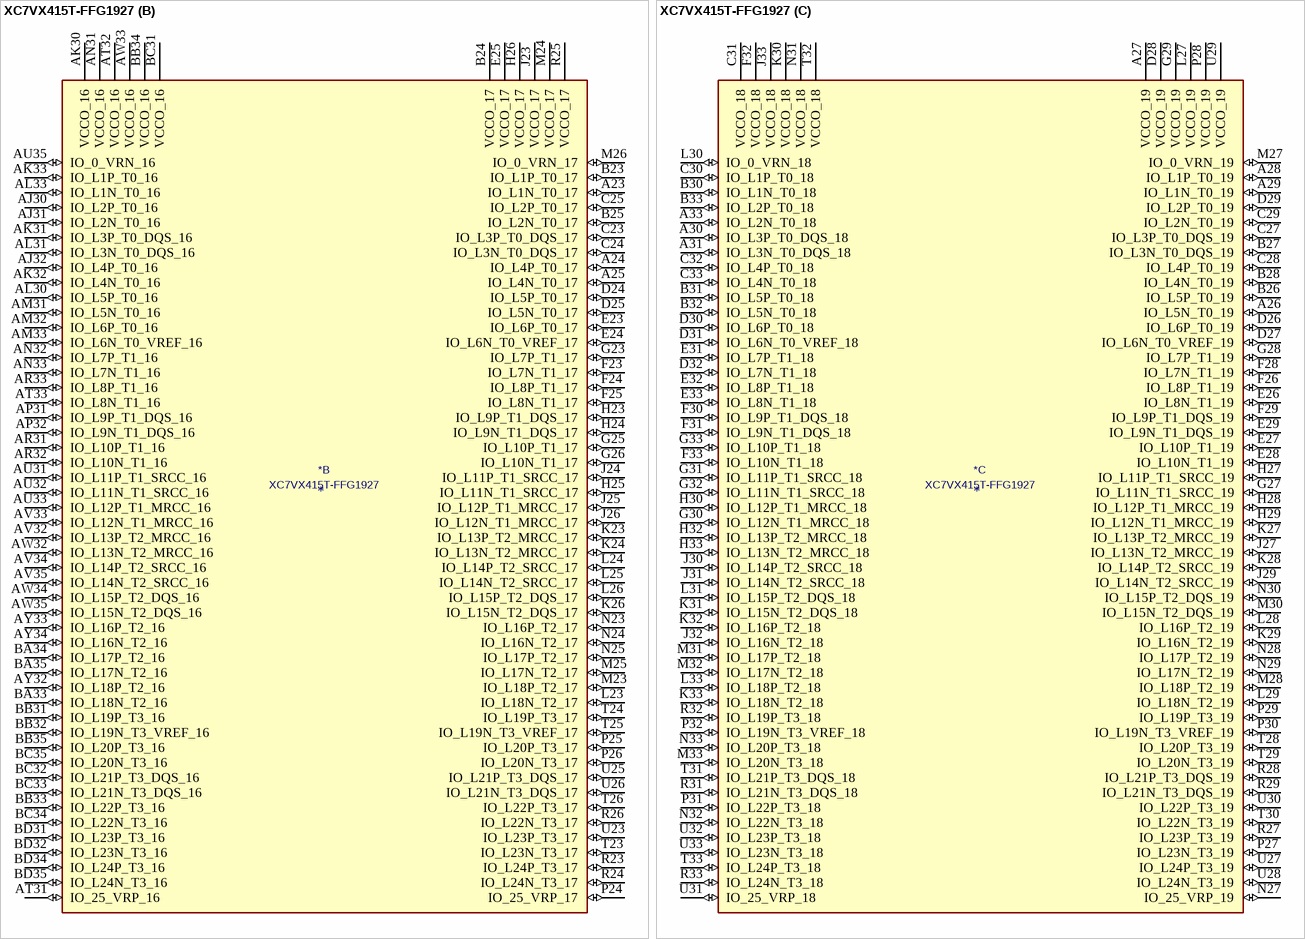
[diagram p68: symbol XC7VX415T-FFG1927]

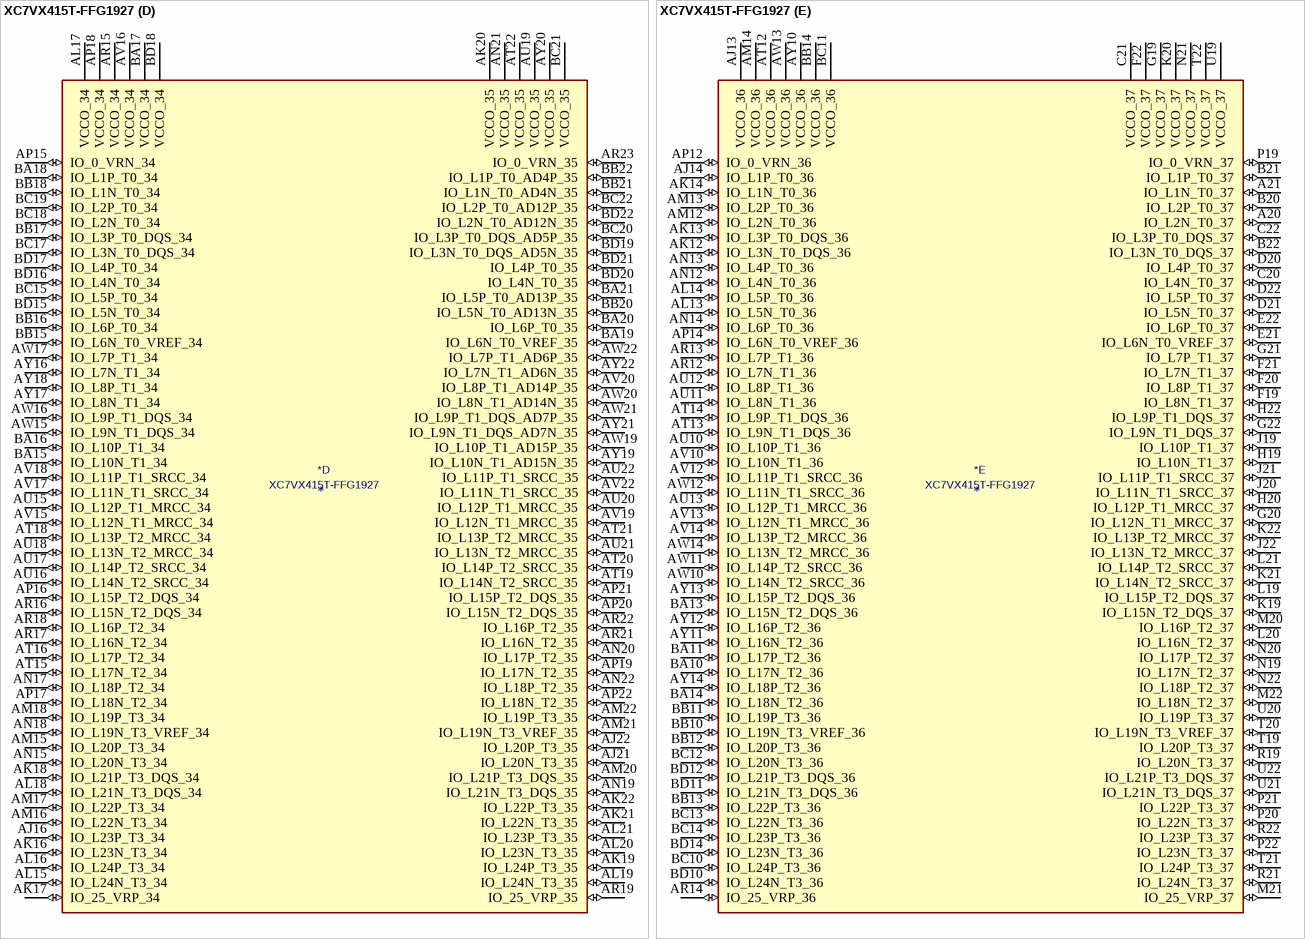
[diagram p69: symbol XC7VX415T-FFG1927]

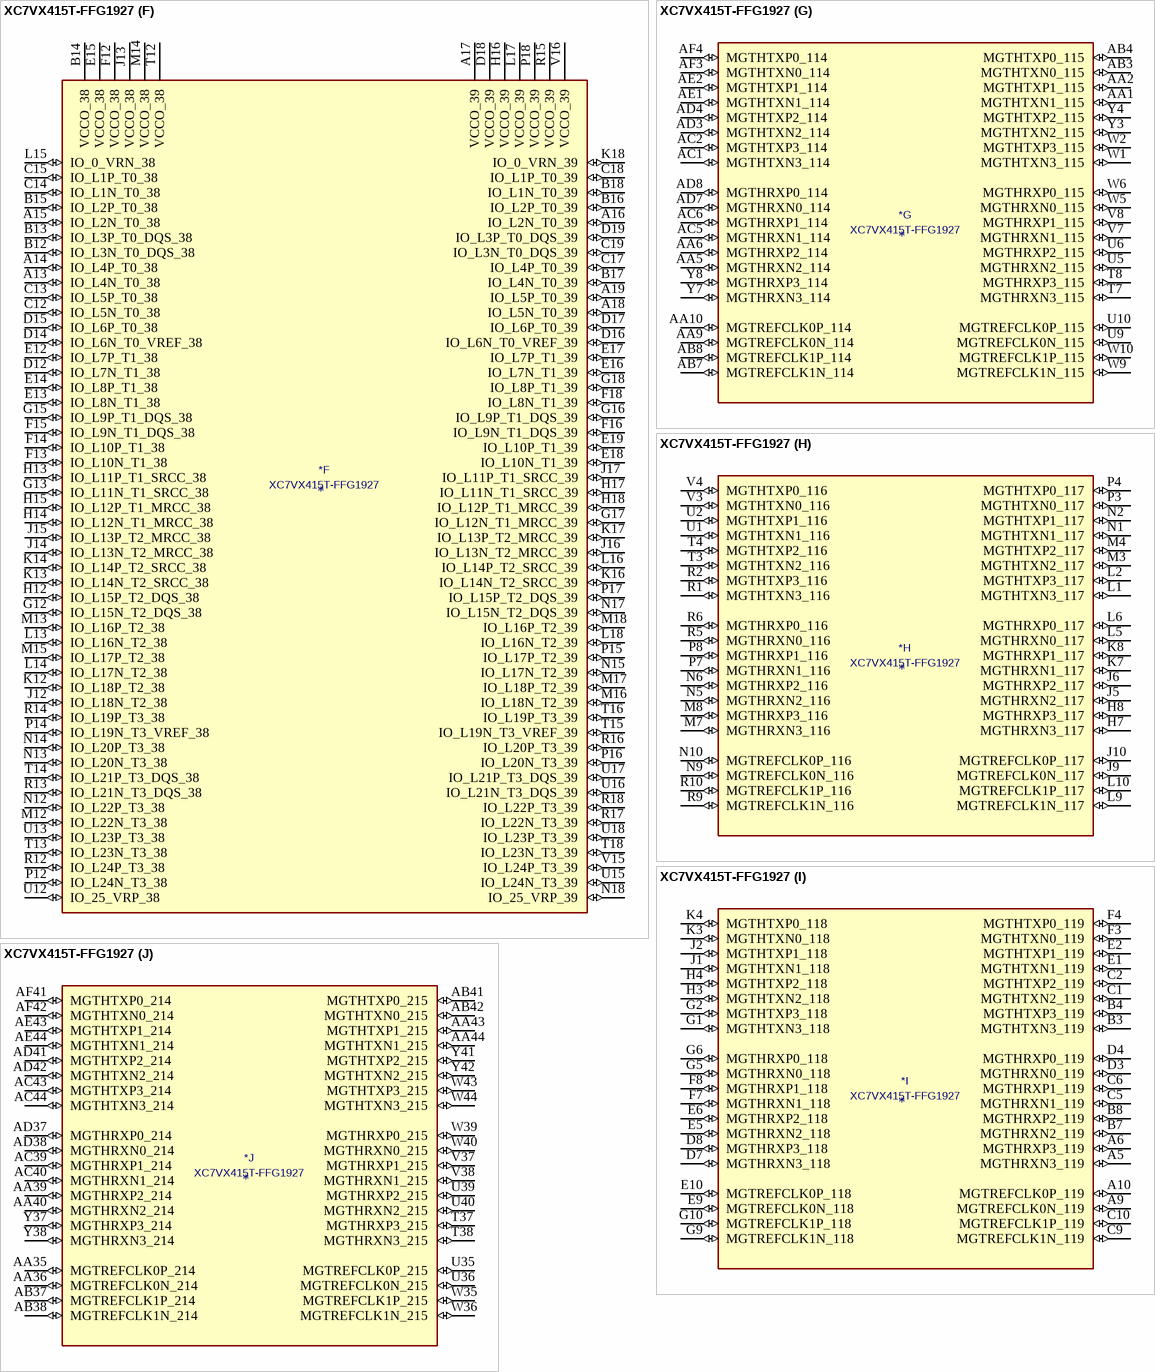
[diagram p70: symbol XC7VX415T-FFG1927]

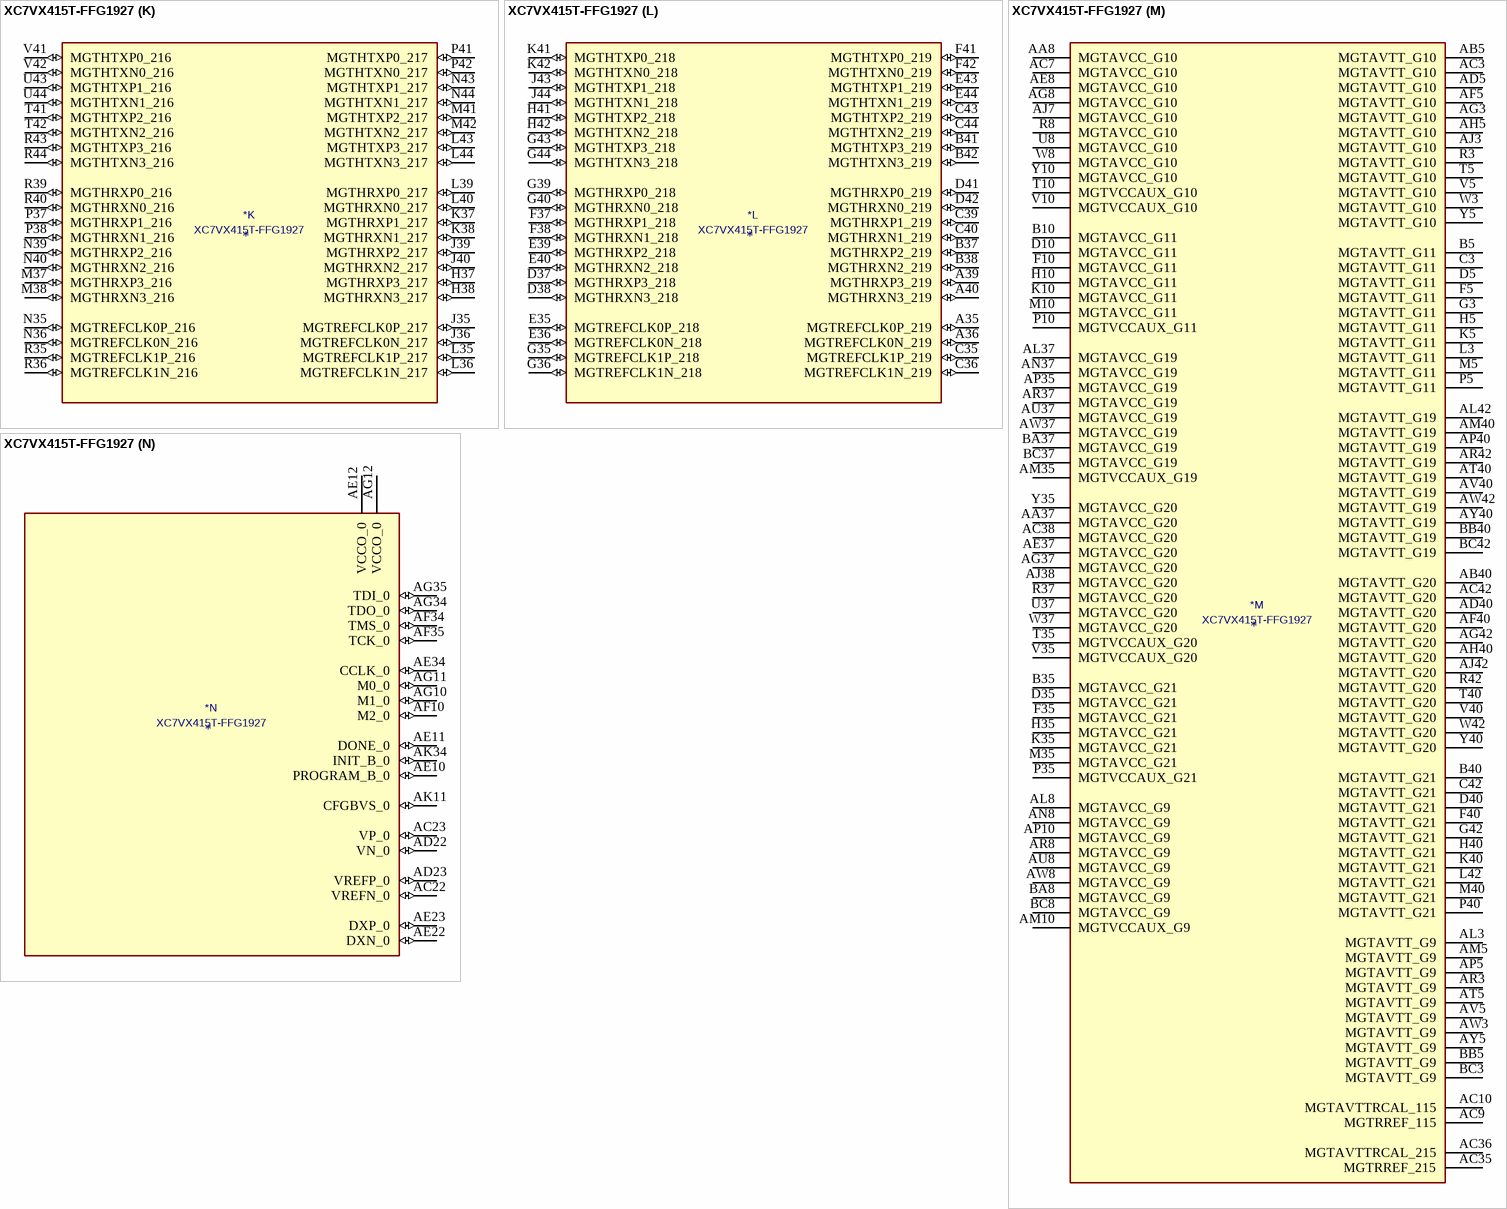
[diagram p71: symbol XC7VX415T-FFG1927]

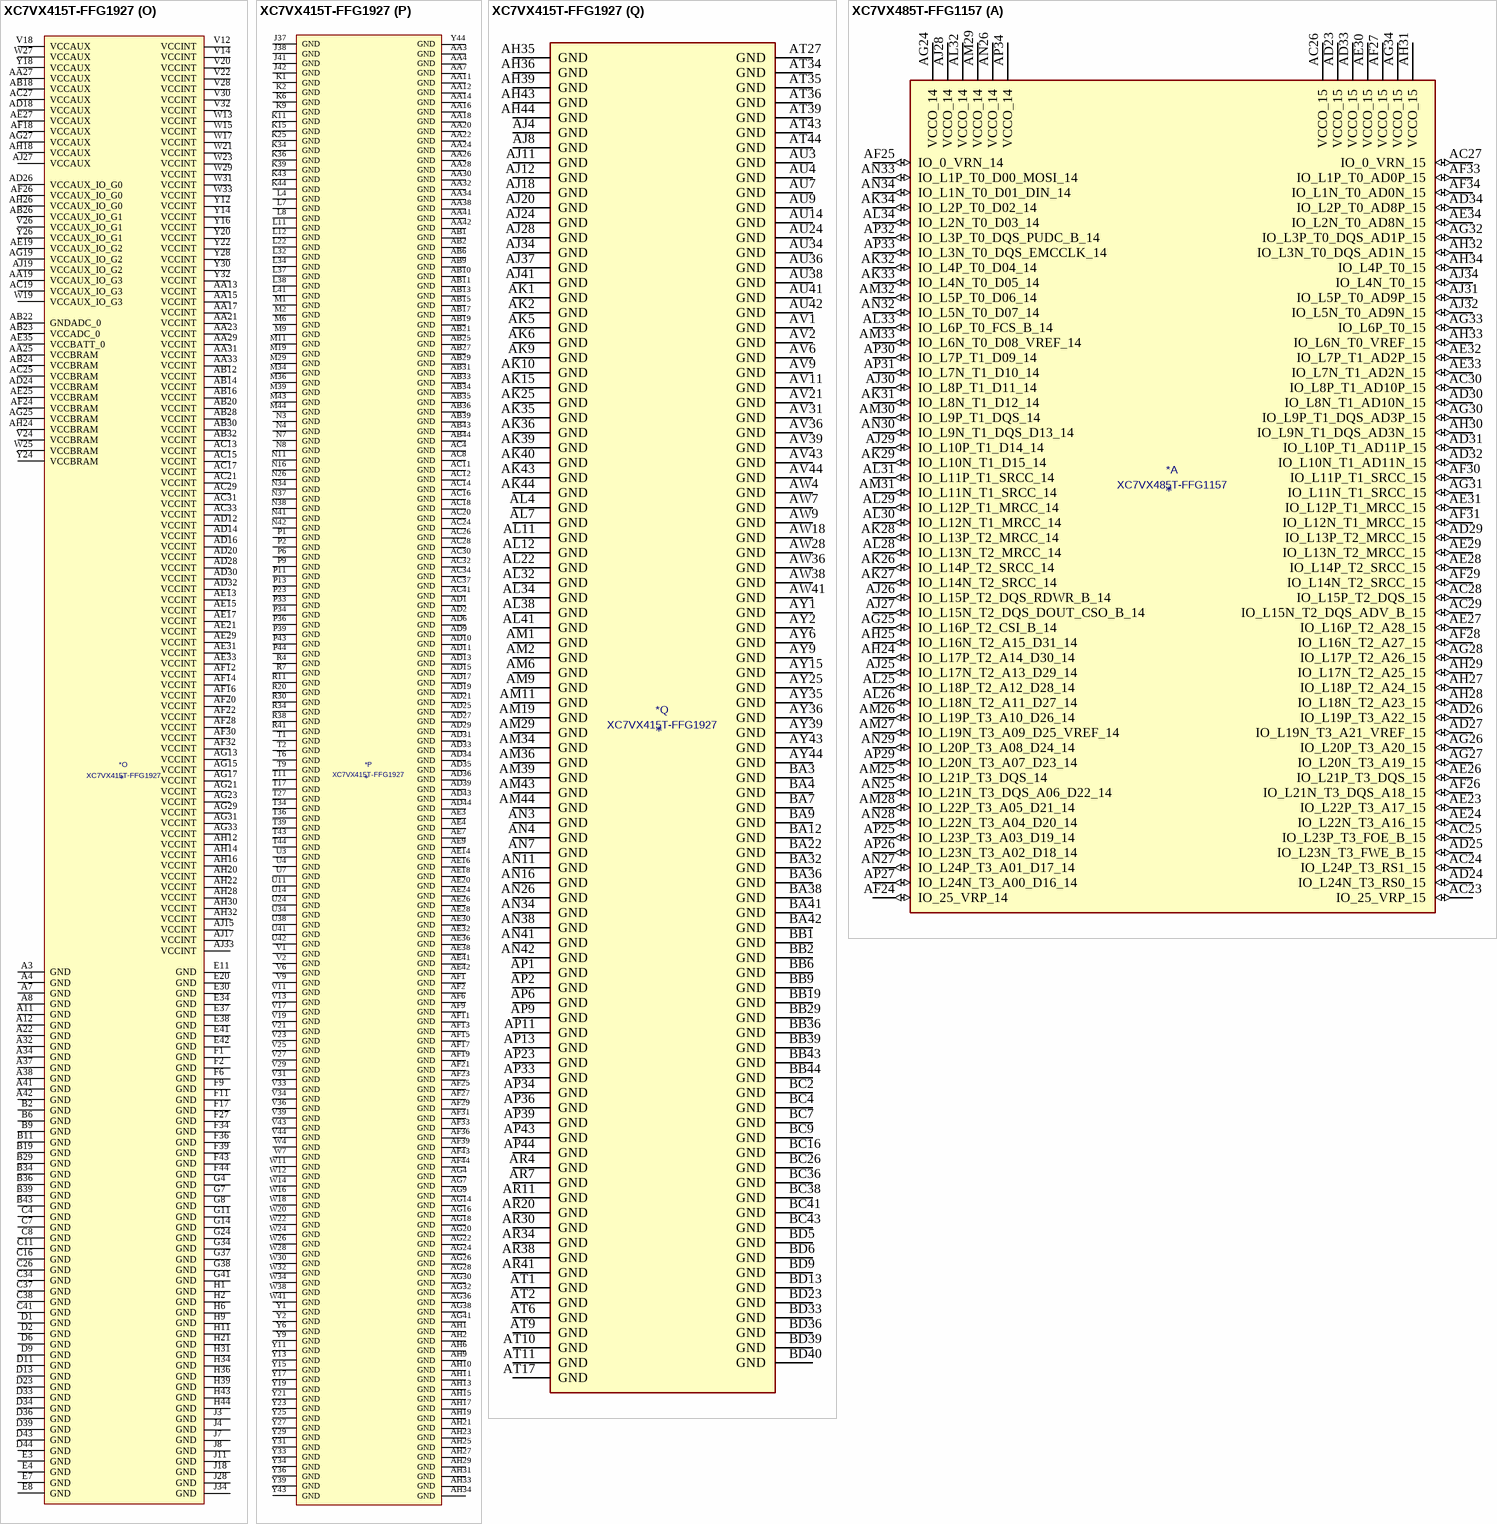
[diagram p72: symbols XC7VX415T-FFG1927 to XC7VX485T-FFG1157]